# Altium footprint library hallglib.PcbLib: 122 footprints (part 8 of 8)
Each footprint in its own frame and in the unit in brackets; x right, y up, seen from the top. Pads: shape width x height; smd on the part's side, far side on the other; paste and mask are expansions set on the pad; w line width, h text height; cw(c..) or ccw(c..) is an arc to the next point about the centre after c.
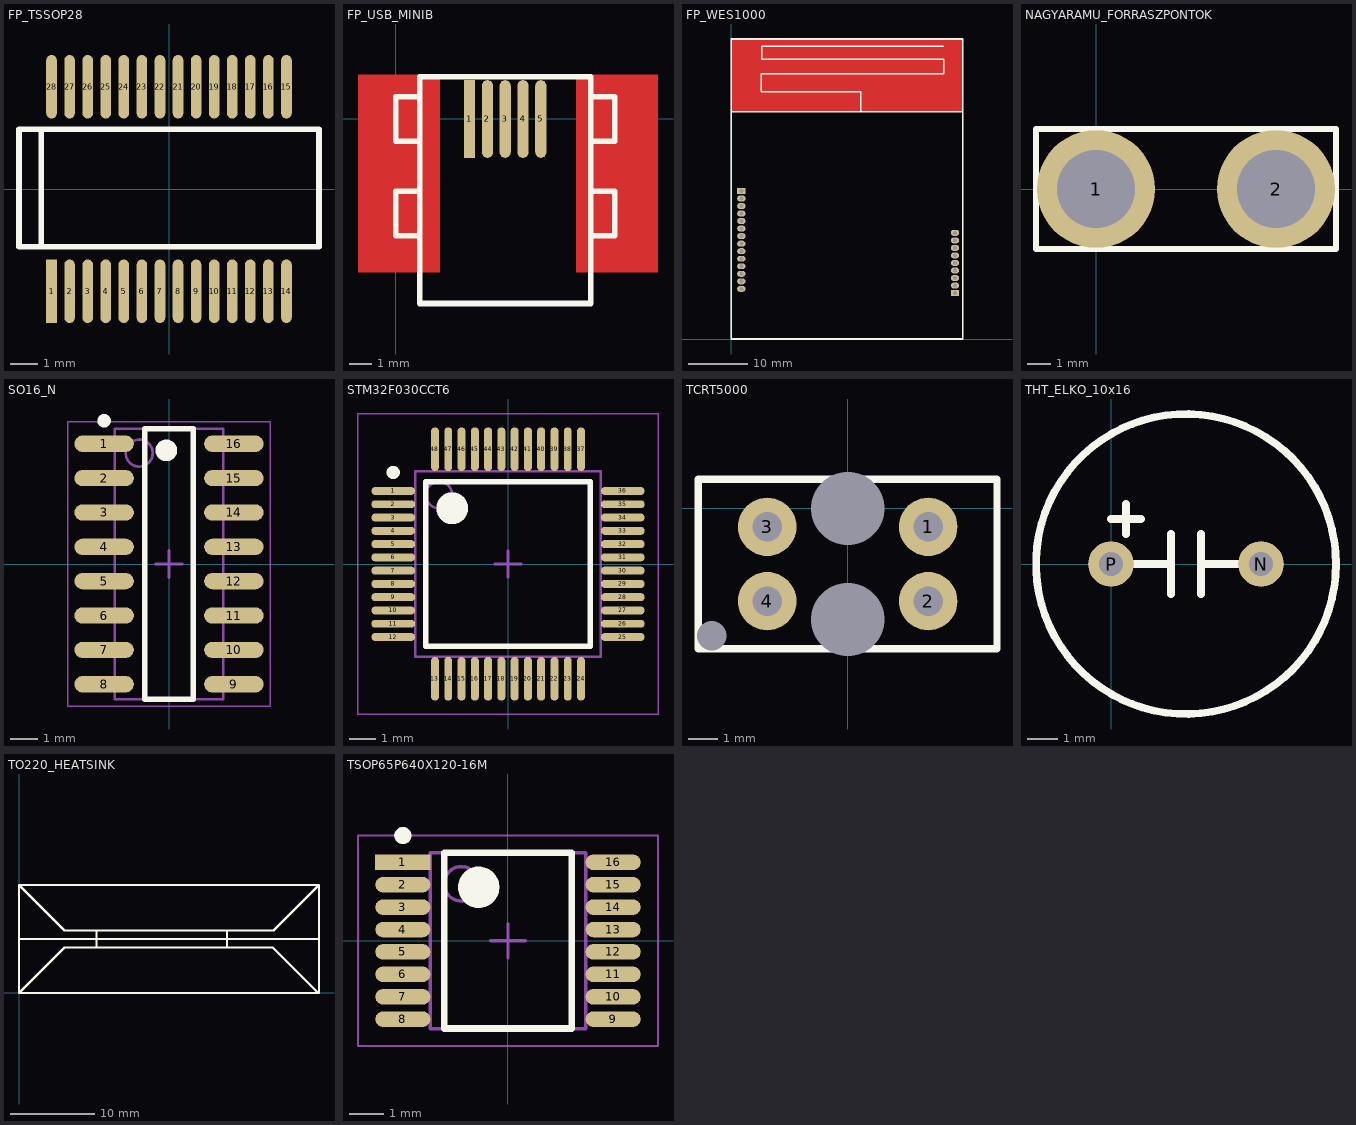
[diagram p7: the footprints below, top view; thin cyan lines are the x and y axes]

## FP_TSSOP28 [mil] "TSSOP28 tokozás"
height 78.74
pads (28):
  rect 15x90 smd: 1(-166.4,-144.83)
  oval 15x90 smd: 2(-140.8,-144.83) 3(-115.2,-144.83) 4(-89.6,-144.83) 5(-64,-144.83) 6(-38.4,-144.83) 7(-12.8,-144.83) 8(12.8,-144.83) 9(38.4,-144.83) 10(64,-144.83) 11(89.6,-144.83) 12(115.2,-144.83) 13(140.8,-144.83) 14(166.4,-144.83) 15(166.4,144.83) 16(140.8,144.83) 17(115.2,144.83) 18(89.6,144.83) 19(64,144.83) 20(38.4,144.83) 21(12.8,144.83) 22(-12.8,144.83) 23(-38.4,144.83) 24(-64,144.83) 25(-89.6,144.83) 26(-115.2,144.83) 27(-140.8,144.83) 28(-166.4,144.83)
Top Overlay:
  lines w8: -181,-81.86 -181,84.83 ; -212.5,-81.86 -212.5,84.83 212.5,84.83 212.5,-81.86 -212.5,-81.86
3D body "TSSOP28-MSA28.STEP": height 84.65, standoff 0, extent -202.76,-154.63 202.76,154.65

## FP_USB_MINIB [mm] "MINI USB csatlakozó"
height 3.9
pads (5):
  rect 0.5x3.5 smd: 1(3.325,0)
  oval 0.5x3.5 smd: 2(4.125,0) 3(4.925,0) 4(5.725,0) 5(6.525,0)
Top Layer:
  rectangle: -1.7,-6.9 2,2
  rectangle: 8.1,-6.9 11.8,2
Top Overlay:
  lines w0.254: 1.075,-5.25 0,-5.25 0,-3.25 1.075,-3.25 ; 1.075,-1 0,-1 0,1 1.075,1 ; 8.775,-5.25 9.85,-5.25 9.85,-3.25 8.775,-3.25 ; 8.775,-1 9.85,-1 9.85,1 8.775,1 ; 1.075,-8.3 1.075,1.9 8.775,1.9 8.775,-8.3 1.075,-8.3
Top Solder:
  rectangle: -1,-1.75 1,1.75
  rectangle: -1,-6.05 1,-2.55
  rectangle: 8.8,-1.75 10.8,1.75
  rectangle: 8.8,-5.95 10.8,-2.45
3D body "USBBMINI.STEP": height 4, standoff -0.05, extent 0.003,-8.335 9.903,0.665

## FP_WES1000 [mm]
height 2
pads (23):
  rect 1.4x1 hole 0.7 mask+0.1: 1(1.676,24.968) 15(37.719,7.747)
  oval 1.4x1 hole 0.7 mask+0.1: 2(1.676,23.698) 3(1.676,22.428) 4(1.676,21.158) 5(1.676,19.888) 6(1.676,18.618) 7(1.676,17.348) 8(1.676,16.078) 9(1.676,14.808) 10(1.676,13.538) 11(1.676,12.268) 12(1.676,10.998) 13(1.676,9.728) 14(1.676,8.458) 16(37.719,9.017) 17(37.719,10.287) 18(37.719,11.557) 19(37.719,12.827) 20(37.719,14.097) 21(37.719,15.367) 22(37.719,16.637) 23(37.719,17.907)
Top Layer:
  pour cut-out: 0,38.3 0,50.6 39,50.6 39,38.3
Bottom Layer:
  pour cut-out: 0,38.3 0,50.6 39,50.6 39,38.3
Top Overlay:
  lines w0.254: 0,38.3 39,38.3 ; 21.8,38.3 21.8,41.7 5,41.7 5,44.7 35.8,44.7 35.8,47.2 5.1,47.2 5.1,49.4 35.7,49.4 ; 0,0 0,50.6 39,50.6 39,0 0,0
Bottom Overlay:
  lines w0.2: 0.576,7.768 0.576,25.758 ; 2.776,7.768 2.776,25.758 ; 36.619,6.957 36.619,18.447 ; 38.819,6.957 38.819,18.447
3D body: height 2, standoff 0, extent -0.127,-0.127 39.127,50.727

## NAGYARAMU_FORRASZPONTOK [mm]
pads (2):
  round 5 hole 3.3: 1(0,0) 2(7.62,0)
Top Overlay:
  lines w0.254: -2.54,-2.54 10.16,-2.54 10.16,2.54 6.985,2.54 0.635,2.54 -2.54,2.54 -2.54,-2.54

## SO16_N [mm] "SOIC, 16-Leads, Body 9.9x3.9mm, Pitch 1.27mm, IPC Medium Density"
height 1.75
pads (16):
  oval 2.2x0.6 smd: 1(-2.4,4.445) 2(-2.4,3.175) 3(-2.4,1.905) 4(-2.4,0.635) 5(-2.4,-0.635) 6(-2.4,-1.905) 7(-2.4,-3.175) 8(-2.4,-4.445) 9(2.4,-4.445) 10(2.4,-3.175) 11(2.4,-1.905) 12(2.4,-0.635) 13(2.4,0.635) 14(2.4,1.905) 15(2.4,3.175) 16(2.4,4.445)
Top Overlay:
  circle w0.4: c-0.1,4.2 r0.2
  circle w0.25: c-2.4,5.295 r0.125
  lines w0.2: -0.9,-5 0.9,-5 0.9,5 -0.9,5 -0.9,-5
Mechanical 13:
  circle w0.1: c-1.1,4.1 r0.5
  lines w0.1: -2,-5 2,-5 2,5 -2,5 -2,-5
Mechanical 15:
  lines w0.05: -3.75,-5.25 3.75,-5.25 3.75,5.25 -3.75,5.25 -3.75,-5.25
  lines w0.1: -0.5,0 0.5,0 ; 0,-0.5 0,0.5
3D body: height 1.75, standoff 0.1, extent -2,-5 2,5

## STM32F030CCT6 [mm]
pads (48):
  oval 1.65x0.3 smd: 1(-4.325,2.75) 2(-4.325,2.25) 3(-4.325,1.75) 4(-4.325,1.25) 5(-4.325,0.75) 6(-4.325,0.25) 7(-4.325,-0.25) 8(-4.325,-0.75) 9(-4.325,-1.25) 10(-4.325,-1.75) 11(-4.325,-2.25) 12(-4.325,-2.75) 25(4.325,-2.75) 26(4.325,-2.25) 27(4.325,-1.75) 28(4.325,-1.25) 29(4.325,-0.75) 30(4.325,-0.25) 31(4.325,0.25) 32(4.325,0.75) 33(4.325,1.25) 34(4.325,1.75) 35(4.325,2.25) 36(4.325,2.75)
  oval 0.3x1.65 smd: 13(-2.75,-4.325) 14(-2.25,-4.325) 15(-1.75,-4.325) 16(-1.25,-4.325) 17(-0.75,-4.325) 18(-0.25,-4.325) 19(0.25,-4.325) 20(0.75,-4.325) 21(1.25,-4.325) 22(1.75,-4.325) 23(2.25,-4.325) 24(2.75,-4.325) 37(2.75,4.325) 38(2.25,4.325) 39(1.75,4.325) 40(1.25,4.325) 41(0.75,4.325) 42(0.25,4.325) 43(-0.25,4.325) 44(-0.75,4.325) 45(-1.25,4.325) 46(-1.75,4.325) 47(-2.25,4.325) 48(-2.75,4.325)
Top Overlay:
  circle w0.6: c-2.1,2.1 r0.3
  circle w0.25: c-4.325,3.45 r0.125
  lines w0.2: -3.1,-3.1 3.1,-3.1 3.1,3.1 -3.1,3.1 -3.1,-3.1
Mechanical 13:
  circle w0.1: c-2.6,2.6 r0.5
  lines w0.1: -3.5,-3.5 3.5,-3.5 3.5,3.5 -3.5,3.5 -3.5,-3.5
Mechanical 15:
  lines w0.05: -5.65,-5.65 5.65,-5.65 5.65,5.65 -5.65,5.65 -5.65,-5.65
  lines w0.1: -0.5,0 0.5,0 ; 0,-0.5 0,0.5
3D body: height 1.6, standoff 0.05, extent -3.5,-3.5 3.5,3.5

## TCRT5000 [mm]
pads (7):
  round 2 hole 1: 1(2.75,-0.63) 2(2.75,-3.17) 3(-2.75,-0.63) 4(-2.75,-3.17)
  round 0 hole 2.5: MH1(0,0) MH2(0,-3.8)
  round 0 hole 1: MH3(-4.65,-4.35)
Top Overlay:
  lines w0.254: -5.1,-4.8 0,-4.8 5.1,-4.8 5.1,1 0,1 -5.1,1 -5.1,-4.8

## THT_ELKO_10x16 [mil]
pads (2):
  round 60 hole 31.5: N(196.85,0) P(0,0)
Top Overlay:
  circle w10: c98.43,0 r196.85
  lines w10: 0,0 78.74,0 ; 0,59.06 39.37,59.06 ; 19.68,39.37 19.68,78.74 ; 78.74,-39.37 78.74,39.37 ; 118.11,39.37 118.11,-39.37 118.11,0 196.85,0

## TO220_HEATSINK [mm]
Top Overlay:
  lines w0.254: 0,6.4 1.4,6.4 35.6,6.4 ; 0.8,12.8 35.6,12.8 ; 1,12.8 0,12.8 ; 35.5,0 30.1,5.4 24.7,5.4 ; 0,0 35.6,0 35.6,12.8 ; 0,0 0,12.8 ; 0,0 5.4,5.4 9.3,5.4 ; 0,12.8 5.4,7.4 9.2,7.4 ; 9.2,7.4 17.6,7.4 24.7,7.4 ; 9.2,7.4 9.2,5.5 9.3,5.4 ; 9.3,5.4 17.6,5.4 24.7,5.4 ; 24.7,5.4 24.7,7.4 ; 24.7,7.4 29,7.4 30.2,7.4 35.6,12.8

## TSOP65P640X120-16M [mm] "TSOP, 16-Leads, Body 5,00x4,40mm, Pitch 0,65mm, IPC Low Density"
height 1.2
pads (16):
  rect 1.6x0.45 smd: 1(-3.05,2.275)
  oval 1.6x0.45 smd: 2(-3.05,1.625) 3(-3.05,0.975) 4(-3.05,0.325) 5(-3.05,-0.325) 6(-3.05,-0.975) 7(-3.05,-1.625) 8(-3.05,-2.275) 9(3.05,-2.275) 10(3.05,-1.625) 11(3.05,-0.975) 12(3.05,-0.325) 13(3.05,0.325) 14(3.05,0.975) 15(3.05,1.625) 16(3.05,2.275)
Top Overlay:
  circle w0.25: c-3.05,3.05 r0.125
  circle w0.6: c-0.85,1.55 r0.3
  lines w0.2: -1.85,-2.55 -1.85,2.55 1.85,2.55 1.85,-2.55 -1.85,-2.55
Mechanical 13:
  circle w0.1: c-1.35,1.65 r0.5
  lines w0.1: -2.25,-2.55 -2.25,2.55 2.25,2.55 2.25,-2.55 -2.25,-2.55
Mechanical 15:
  lines w0.05: -4.35,-3.05 -4.35,3.05 4.35,3.05 4.35,-3.05 -4.35,-3.05
  lines w0.1: -0.5,0 0.5,0 ; 0,-0.5 0,0.5
3D body: height 1.2, standoff 0.15, extent -2.25,-2.55 2.25,2.55